# Altium footprint library TO.PcbLib: 24 footprints (part 1 of 2)
Each footprint in its own frame and in the unit in brackets; x right, y up, seen from the top. Pads: shape width x height; smd on the part's side, far side on the other; paste and mask are expansions set on the pad; w line width, h text height; cw(c..) or ccw(c..) is an arc to the next point about the centre after c.
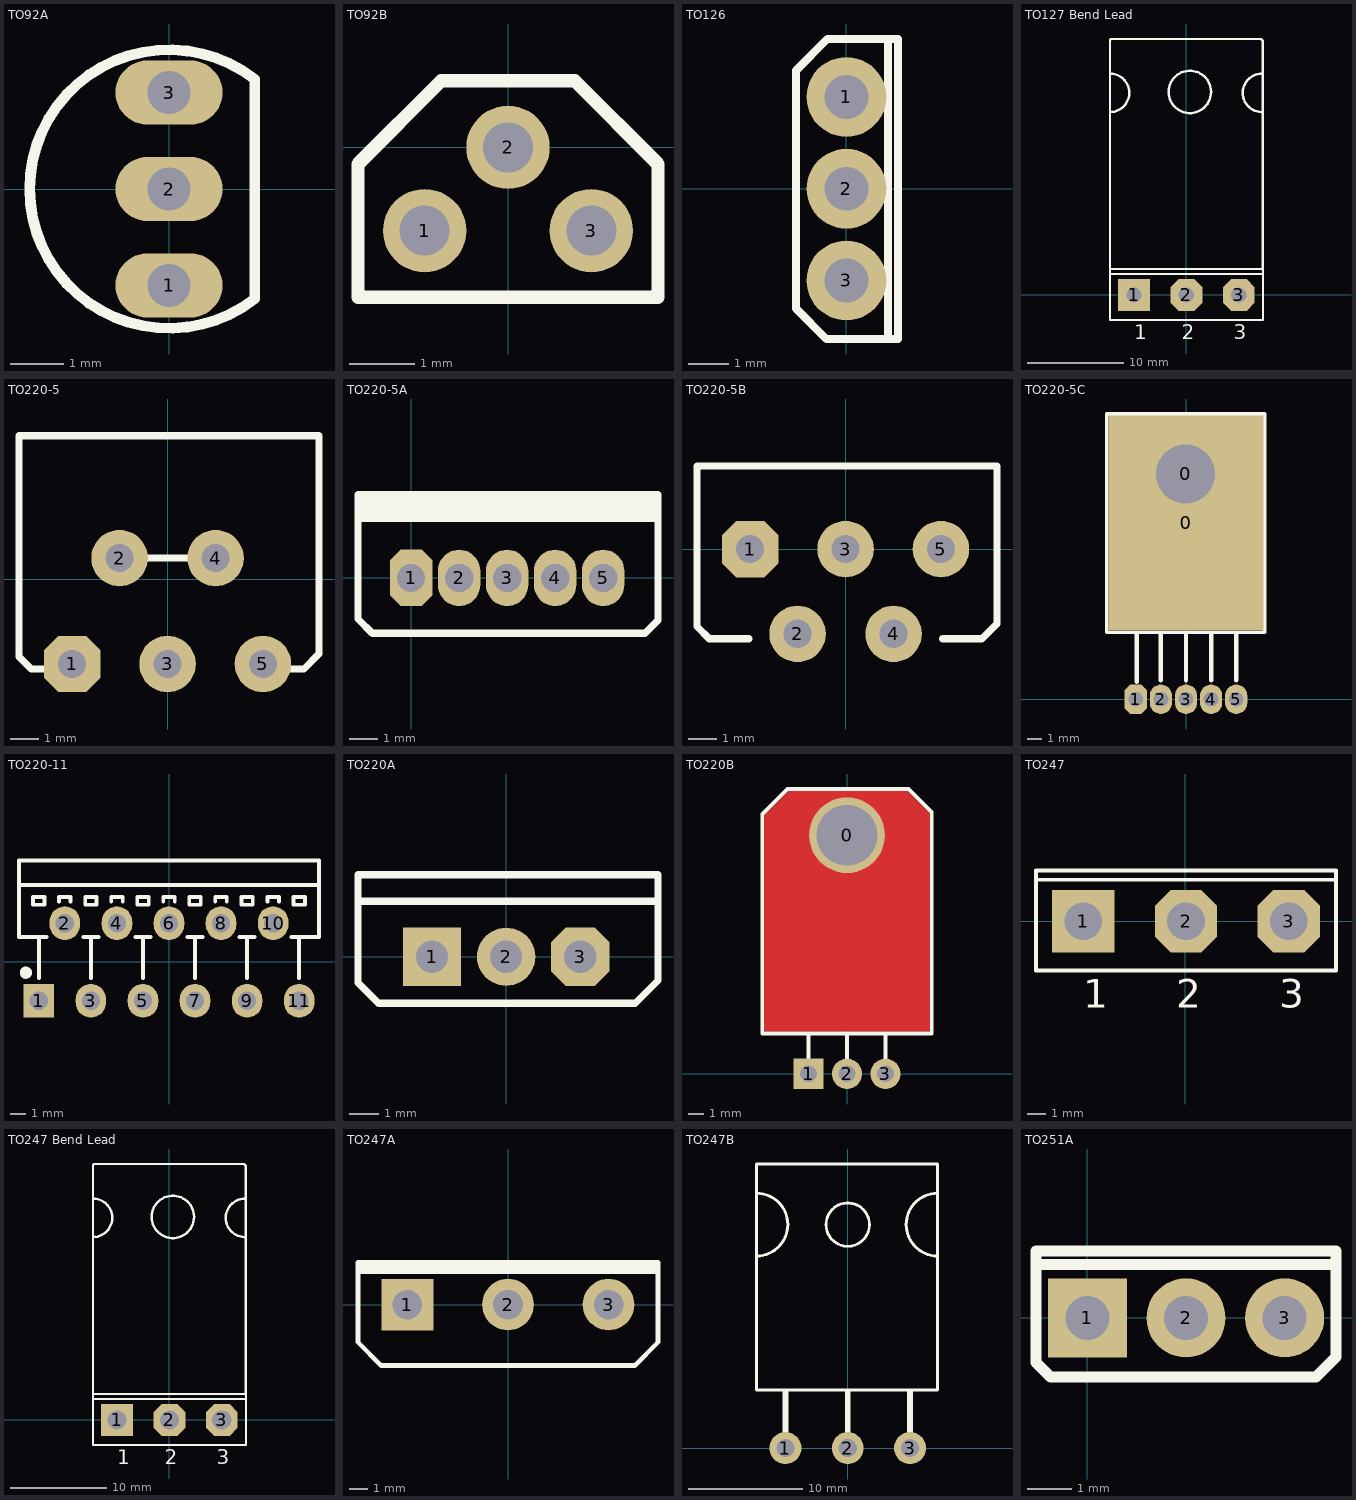
[diagram p0: the footprints below, top view; thin cyan lines are the x and y axes]

## TO92A [mm] "92¾§Ìå¹Ü"
height 5.33
pads (3):
  oval 2x1.2 hole 0.8: 1(0,-1.8) 2(0,0) 3(0,1.8)
Top Overlay:
  lines w0.2: 1.601,-2.049 cw(c0,0) 1.601,2.049 ; 1.6,-1.99 1.6,1.99
3D body "TO92A.STEP": height 7.6, standoff -3, extent -2.3,-2.3 1.3,2.3

## TO92B [mil] "92¾§Ìå¹Ü"
pads (3):
  round 50 hole 30: 1(-50,-50) 2(0,0) 3(50,-50)
Top Overlay:
  lines w8: -90,-90 90,-90 90,-10 40,40 -40,40 -90,-10 -90,-90
3D body "TO92B.STEP": height 118.11, standoff -299.21, extent -90.55,-100.99 90.55,40.55

## TO126 [mm] "126¾§Ìå¹Ü"
pads (3):
  round 2 hole 1.1: 1(0,2.3) 2(0,0) 3(0,-2.3)
Top Overlay:
  lines w0.2: 1.041,-3.734 1.041,3.734 ; -1.268,-3.005 -1.268,2.964 -0.48,3.752 1.295,3.752 1.295,-3.767 -0.506,-3.767 -1.268,-3.005
3D body "TO126.STEP": height 15, standoff -4, extent -1.2,-4 1.6,4

## TO127 Bend Lead [mm] "TO-127 Bend Lead , Suitable for Power Hexfet Mosfets"
pads (3):
  rect 3.3x3.3 hole 1.6: 1(-5.404,-0.014)
  oct 3.3x3.3 hole 1.6: 2(0.046,-0.014) 3(5.496,-0.014)
Top Overlay:
  circle w0.254: c0.4,21.1 r2.202
  lines w0.2: -7.904,2.186 7.996,2.186 ; -7.904,-2.614 -7.904,2.686 7.996,2.686 7.996,-2.614 -7.904,-2.614
  lines w0.254: -7.902,19 ccw(c-7.9,21) -7.854,22.999 ; -7.9,2.7 -7.9,26.5 -7.8,26.6 7.8,26.6 8,26.4 8,2.6 ; 7.854,19.001 cw(c7.9,21) 7.902,23
  text "3" at 4.988,-4.589 h1.5
  text "2" at -0.462,-4.589 h1.5
  text "1" at -5.404,-4.589 h1.5
3D body "TO-247_bent_leads.step": height 2.9, standoff -9.1, extent -7.9,-0.391 8,26.591

## TO220-5 [mm] "220£¬5ÌØÊâ·â×°(¸Ã·â×°Îª¹Ë¿ÍÌá¹©£©"
pads (5):
  oct 2x2 hole 1: 1(-3.378,-3)
  round 2 hole 1: 2(-1.7,0.75) 3(0,-3) 4(1.7,0.75) 5(3.378,-3)
Top Overlay:
  lines w0.254: -3.429,-3.175 -4.826,-3.175 -5.258,-2.743 -5.258,1.34 -5.258,5.08 5.362,5.08 5.362,1.432 5.362,-2.639 4.826,-3.175 3.429,-3.175 ; -1.7,0.75 1.7,0.75
3D body "SW3dPS-TO220-5.STEP": height 21.35, standoff -2.64, extent -5.08,-3.25 5.08,4.99

## TO220-5A [mm] "220£¬5½Å¾§Ìå¹Ü"
pads (5):
  oct 1.5x2 hole 1: 1(0,0)
  oval 1.5x2 hole 1: 2(1.7,0) 3(3.4,0) 4(5.1,0) 5(6.8,0)
Top Overlay:
  rectangle: -1.88,2.189 8.74,2.946
  lines w0.254: -1.88,2.102 8.74,2.102 ; -1.88,-1.454 -1.88,1.34 -1.88,2.946 8.74,2.946 8.74,1.432 8.74,-1.502 8.28,-1.962 -1.372,-1.962 -1.88,-1.454
3D body "TO220-5A.STEP": height 17.5, standoff -4, extent -1.65,-1.8 8.45,2.7

## TO220-5B [mm] "220£¬5½Å¾§Ìå¹Ü"
pads (5):
  oct 2x2 hole 1: 1(-3.378,0)
  round 2 hole 1: 2(-1.7,-3) 3(0,0) 4(1.7,-3) 5(3.378,0)
Top Overlay:
  lines w0.254: -3.429,-3.175 -4.826,-3.175 -5.258,-2.743 -5.258,1.34 -5.258,2.946 5.362,2.946 5.362,1.432 5.362,-2.639 4.826,-3.175 3.429,-3.175
3D body "TO220-5B.STEP": height 17.5, standoff -4, extent -5.05,-3.225 5.05,2.7

## TO220-5C [mm] "220£¬5½Å¾§Ìå¹Ü"
pads (7):
  round 4.2 hole 4: 0(-0.022,15.247)
  rect 10.5x14.5 smd: 0(0,11.938)
  oct 1.5x2 hole 1: 1(-3.4,0)
  oval 1.5x2 hole 1: 2(-1.7,0) 3(0,0) 4(1.7,0) 5(3.4,0)
Top Overlay:
  lines w0.254: -5.356,4.528 -5.356,19.304 5.312,19.304 5.312,4.528 -3.832,4.528 -5.356,4.528
  lines w0.3: -3.324,1.194 -3.324,4.369 ; -1.7,1.27 -1.7,4.445 ; 0,1.27 0,4.445 ; 1.7,1.27 1.7,4.445 ; 3.4,1.27 3.4,4.445
3D body "TO220-5C.STEP": height 4.5, standoff -3, extent -5.05,-0.225 5.05,18.1

## TO220-11 [mm] "220,11½ÅÖ±²å"
pads (11):
  rect 2x2.2 hole 1.2: 1(-8.5,-2.54)
  oval 2x2.2 hole 1.2: 2(-6.8,2.54) 3(-5.1,-2.54) 4(-3.4,2.54) 5(-1.7,-2.54) 6(0,2.54) 7(1.7,-2.54) 8(3.4,2.54) 9(5.1,-2.54) 10(6.8,2.54) 11(8.5,-2.54)
Top Overlay:
  circle w0.4: c-9.35,-0.7 r0.2
  lines w0.254: -8.5,-1.06 -8.5,1.64 ; -8,1.64 -9.8,1.64 -9.8,5.04 ; -7.175,3.94 -7.175,4.24 -6.425,4.24 -6.425,3.94 ; -5.6,1.64 -4.6,1.64 ; -5.1,-1.06 -5.1,1.64 ; -3.775,3.94 -3.775,4.24 -3.025,4.24 -3.025,3.94 ; -2.2,1.64 -1.2,1.64 ; -1.7,-1.06 -1.7,1.64 ; -0.375,3.94 -0.375,4.24 0.375,4.24 0.375,3.94 ; 1.2,1.64 2.2,1.64 ; 1.7,-1.06 1.7,1.64 ; 3.025,3.94 3.025,4.24 3.775,4.24 3.775,3.94 ; 4.6,1.64 5.6,1.64 ; 5.1,-1.06 5.1,1.64 ; 6.425,3.94 6.425,4.24 7.175,4.24 7.175,3.94 ; 8,1.64 9.8,1.64 9.8,5.04 ; 8.5,-1.06 8.5,1.64 ; -9.8,5.04 -9.8,6.64 9.8,6.64 9.8,5.04 ; -9.8,5.04 9.8,5.04 ; -8.875,3.74 -8.875,4.24 -8.125,4.24 -8.125,3.74 -8.875,3.74 ; -5.475,3.74 -4.725,3.74 -4.725,4.24 -5.475,4.24 -5.475,3.74 ; -2.075,3.74 -1.325,3.74 -1.325,4.24 -2.075,4.24 -2.075,3.74 ; 1.325,3.74 2.075,3.74 2.075,4.24 1.325,4.24 1.325,3.74 ; 4.725,3.74 5.475,3.74 5.475,4.24 4.725,4.24 4.725,3.74 ; 8.125,3.74 8.125,4.24 8.875,4.24 8.875,3.74 8.125,3.74
3D body "User Library-TO-220-11.STEP": height 22.13, standoff -3.16, extent -10.125,-2.794 10.125,6.776

## TO220A [mm] "220£¬3½Å¾§Ìå¹Ü"
pads (3):
  rect 2x2 hole 1.1: 1(-2.54,0)
  round 2 hole 1.1: 2(0,0)
  oct 2x2 hole 1.1: 3(2.54,0)
Top Overlay:
  lines w0.254: -4.928,1.905 5.131,1.905 ; -5.08,-0.889 -5.08,2.819 5.207,2.819 5.207,-0.813 4.42,-1.6 -4.369,-1.6 -5.08,-0.889
3D body "TO220A.STEP": height 18.5, standoff -4, extent -5.15,-1.53 5.15,2.9

## TO220B [mm] "220£¬3½Å¾§Ìå¹Ü"
pads (4):
  round 5 hole 4: 0(0,15.748)
  rect 2x2 hole 1.1: 1(-2.54,0)
  round 2 hole 1.1: 2(0,0) 3(2.54,0)
Top Layer:
  rectangle: -5.334,2.921 5.334,17.018
  rectangle: -3.81,16.891 4.064,18.542
  rectangle: 4.064,16.891 4.699,17.78
  rectangle: -4.572,16.891 -3.81,17.653
  rectangle: -4.318,17.653 -3.81,18.034
  rectangle: -4.826,17.018 -4.572,17.526
  rectangle: 4.445,16.891 5.143,17.335
  rectangle: 3.81,17.526 4.445,18.034
  lines w0.254: -5.207,16.891 -3.81,18.288 ; -4.826,17.018 -3.81,18.034 ; 3.937,18.288 4.826,17.272 5.334,17.018 4.699,17.526 ; -5.334,2.921 -5.334,16.637 -5.334,17.018 -4.826,17.526 -3.81,18.542 3.429,18.542 3.937,18.542 4.953,17.526 5.334,17.145 5.334,3.429 5.334,2.921 -5.08,2.921 -5.334,2.921
Top Overlay:
  lines w0.254: -2.54,0.737 -2.54,2.667 ; 0,0.711 0,2.667 ; 2.54,0.686 2.54,2.667 ; -5.588,2.667 5.588,2.667 5.588,17.272 4.064,18.796 -3.937,18.796 -5.588,17.145 -5.588,2.667
3D body "TO220B.STEP": height 4.43, standoff -3, extent -5.15,-0.25 5.15,18.5

## TO247 [mm] "TO-247"
pads (3):
  rect 3.3x3.3 hole 2: 1(-5.404,-0.014)
  oct 3.3x3.3 hole 2: 2(0.046,-0.014) 3(5.496,-0.014)
Top Overlay:
  lines w0.2: -7.904,2.186 7.996,2.186 ; -7.904,-2.614 7.996,-2.614 7.996,2.686 -7.904,2.686 -7.904,-2.614
  text "1" at -5.404,-4.589 h1.5
  text "2" at -0.462,-4.589 h1.5
  text "3" at 4.988,-4.589 h1.5
3D body "User Library-TO247.STEP": height 24.16, standoff -17.75, extent -8,-2.75 8.26,2.55

## TO247 Bend Lead [mm] "TO-127 Bend Lead , Suitable for Power Hexfet Mosfets"
pads (3):
  rect 3.3x3.3 hole 2: 1(-5.404,-0.014)
  oct 3.3x3.3 hole 2: 2(0.046,-0.014) 3(5.496,-0.014)
Top Overlay:
  circle w0.254: c0.4,21.1 r2.202
  lines w0.2: -7.904,2.186 7.996,2.186 ; -7.904,-2.614 -7.904,2.686 7.996,2.686 7.996,-2.614 -7.904,-2.614
  lines w0.254: -7.902,19 ccw(c-7.9,21) -7.854,22.999 ; -7.9,2.7 -7.9,26.5 -7.8,26.6 7.8,26.6 8,26.4 8,2.6 ; 7.854,19.001 cw(c7.9,21) 7.902,23
  text "3" at 4.988,-4.589 h1.5
  text "2" at -0.462,-4.589 h1.5
  text "1" at -5.404,-4.589 h1.5
3D body "User Library-TO-247_bent_leads.step": height 2.9, standoff -9.1, extent -7.9,-0.741 8,26.241

## TO247A [mm] "247£¬3½Å¾§Ìå¹Ü"
pads (3):
  rect 2.8x2.8 hole 1.6: 1(-5.45,0)
  round 2.8 hole 1.6: 2(0,0) 3(5.45,0)
Top Overlay:
  lines w0.254: -8.128,1.778 -8.128,2.032 ; -8.128,1.778 -8.128,-2.032 -6.858,-3.302 6.858,-3.302 8.128,-2.032 8.128,1.778 ; -8.128,1.778 8.128,1.778 ; -8.128,2.032 -8.128,2.286 8.128,2.286 8.128,1.778 ; -8.128,2.032 8.128,2.032 8.128,1.778
3D body "TO247A.STEP": height 24, standoff -6, extent -7.75,-3 7.75,2

## TO247B [mm] "247£¬3½Å¾§Ìå¹Ü"
pads (3):
  round 2.8 hole 1.6: 1(-5.461,0) 2(0,0) 3(5.461,0)
Top Overlay:
  circle w0.254: c0,19.58 r1.9
  lines w0.254: -8.001,16.83 ccw(c-8.001,19.58) -8.001,22.33 ; 7.874,16.83 cw(c7.874,19.58) 7.874,22.33 ; -8.001,5.08 7.874,5.08 7.874,24.892 -8.001,24.892 -8.001,5.08
  lines w0.508: -5.461,1.397 -5.461,4.953 ; 0,1.397 0,4.953 ; 5.461,1.397 5.461,4.953
3D body "TO247B.STEP": height 5, standoff -4, extent -7.75,-0.35 7.75,25

## TO251A [mm] "251£¬3½Å¾§Ìå¹Ü"
height 0.9
pads (3):
  rect 1.8x1.8 hole 1: 1(0,0)
  round 1.8 hole 1: 2(2.248,0) 3(4.496,0)
Top Overlay:
  lines w0.254: -1.168,1.219 5.639,1.219 ; -1.168,-1.016 -0.838,-1.346 5.207,-1.346 5.664,-0.889 5.664,1.524 -1.168,1.524 -1.168,-1.016
3D body "TO251A.STEP": height 9.91, standoff -5, extent -1.052,-1.05 5.548,1.25